# Altium footprint library ThanhNT.PcbLib: 579 footprints (part 8 of 37)
Each footprint in its own frame and in the unit in brackets; x right, y up, seen from the top. Pads: shape width x height; smd on the part's side, far side on the other; paste and mask are expansions set on the pad; w line width, h text height; cw(c..) or ccw(c..) is an arc to the next point about the centre after c.
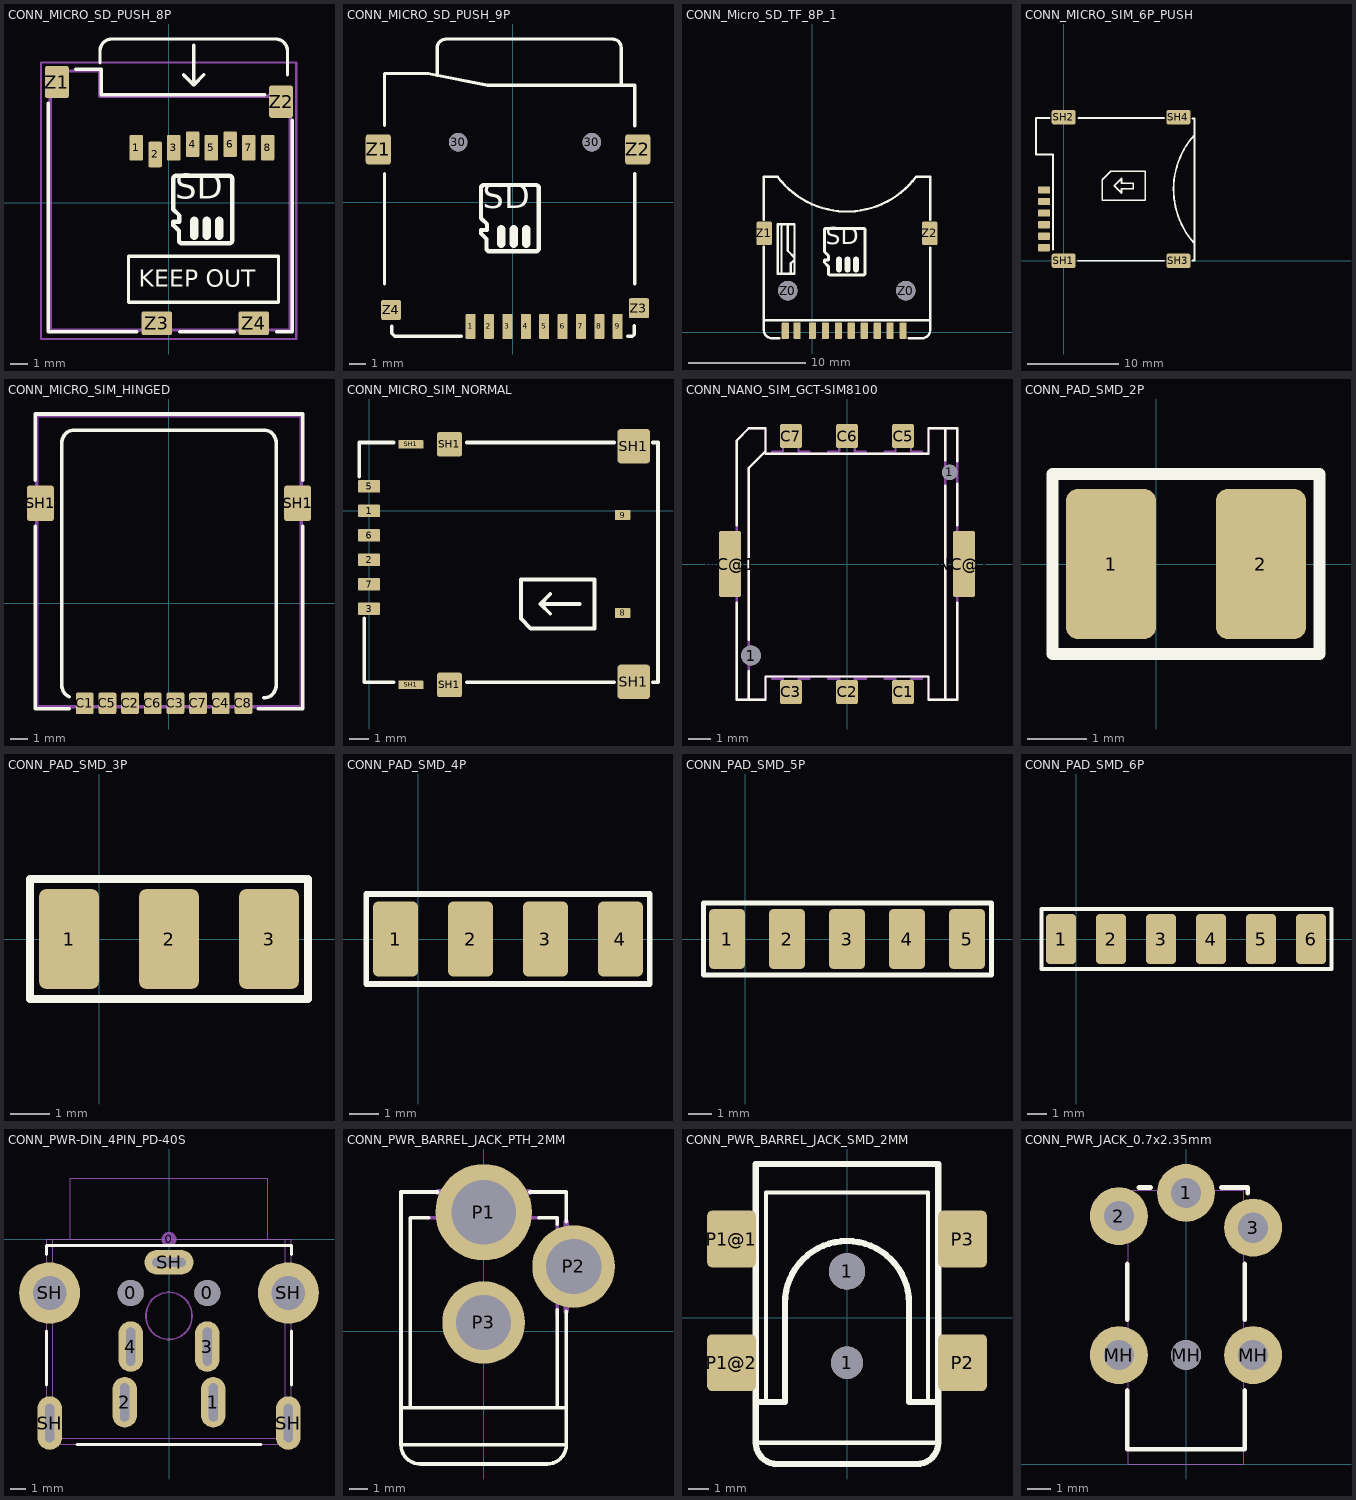
[diagram p7: the footprints below, top view; thin cyan lines are the x and y axes]

## CONN_MICRO_SD_PUSH_8P [mm] "WR-CRD Micro SD_Push and Push_Card Detection_8 pins (MinhHa TF v5)"
height 1.98
pads (12):
  rrect20% 0.8x1.5 smd: 1(-1.915,3.225) 2(-0.815,2.825) 3(0.285,3.225) 4(1.385,3.425) 5(2.485,3.225) 6(3.585,3.425) 7(4.685,3.225) 8(5.785,3.225)
  rrect20% 1.4x1.9 smd: Z1(-6.575,7.075) Z2(6.575,5.925)
  rrect20% 1.8x1.4 smd: Z3(-0.715,-7.075) Z4(4.975,-7.075)
Top Overlay:
  lines w0.2: -7.075,5.825 -7.075,-7.575 -1.875,-7.575 ; -5.475,7.825 -3.975,7.825 -3.975,6.325 5.625,6.325 ; -4.05,8.2 -4.05,8.9 cw(c-3.35,8.9) -3.35,9.6 6.25,9.6 cw(c6.25,8.9) 6.95,8.9 6.95,7.5 ; 0.625,-7.575 3.825,-7.575 ; 0.85,7.5 1.45,6.9 ; 1.45,9.25 1.45,6.9 ; 2.05,7.5 1.45,6.9 ; 6.325,-7.575 7.225,-7.575 7.225,4.825 ; -2.375,-5.847 6.425,-5.847 6.425,-3.147 -2.375,-3.147 -2.375,-5.847
  lines w0.254: 0.254,-1.321 0.254,-1.118 0.61,-1.118 0.61,-0.762 0.254,-0.406 0.254,1.321 0.254,1.401 cw(c0.427,1.401) 0.305,1.524 cw(c0.427,1.401) 0.427,1.575 0.508,1.575 3.454,1.575 3.535,1.575 cw(c3.535,1.401) 3.658,1.524 cw(c3.535,1.401) 3.708,1.401 3.708,1.321 3.708,-2.134 3.708,-2.214 cw(c3.535,-2.214) 3.658,-2.337 cw(c3.535,-2.214) 3.535,-2.388 3.454,-2.388 0.838,-2.388 0.758,-2.388 cw(c0.758,-2.214) 0.635,-2.337 cw(c0.758,-2.214) 0.584,-2.214 0.584,-2.134 0.584,-1.651 0.254,-1.321
  lines w0.508: 1.473,-1.93 1.473,-1.067 ; 2.21,-1.93 2.21,-1.067 ; 2.946,-1.93 2.946,-1.067
  text "SD" at 0.356,-0.279 h2.5
  text "KEEP OUT" at -1.775,-4.947 h1
Mechanical 15:
  lines w0.127: -7.518,-8.001 7.468,-8.001 7.468,8.23 -7.518,8.23 -7.518,-8.001
Mechanical 16:
  lines w0.2: -6.975,-7.475 -6.975,7.725 -4.075,7.725 -4.075,6.225 5.825,6.225 6.325,6.725 7.125,6.725 7.125,-7.475 -6.975,-7.475
3D body "693071010811.stp": height 1.84, standoff -0.06, extent -6.975,-7.625 7.025,7.585

## CONN_MICRO_SD_PUSH_9P [mm] "WR-CRD Micro SD_Push and Push_Card Detection_9 pins (MinhHa TF v3)"
pads (15):
  rrect20% 0.6x1.5 smd mask+0.01: 1(-2.529,-7.442) 2(-1.429,-7.442) 3(-0.329,-7.442) 4(0.771,-7.442) 5(1.871,-7.442) 6(2.971,-7.442) 7(4.071,-7.442) 8(5.171,-7.442) 9(6.271,-7.442)
  round 1.1 hole 1.1 unplated: 30(-3.276,3.581) 30(4.724,3.581)
  rrect20% 1.5x1.8 smd mask+0.01: Z1(-8.052,3.15) Z2(7.468,3.15)
  rrect20% 1.2x1.2 smd mask+0.01: Z3(7.544,-6.35) Z4(-7.29,-6.452)
Top Overlay:
  lines w0.2: -7.678,-4.902 -7.678,1.702 ; -7.678,4.6 -7.678,7.69 -5.068,7.69 -1.508,6.98 7.29,6.98 ; -7.239,-7.417 -7.239,-7.85 -7.058,-8.03 -7.028,-8.03 -3.078,-8.03 ; -4.521,7.576 -4.521,9.269 cw(c-4.088,9.269) -4.394,9.576 cw(c-3.965,9.147) -3.965,9.754 5.957,9.754 cw(c5.957,9.233) 6.325,9.601 cw(c5.957,9.233) 6.477,9.233 6.477,6.98 ; 6.881,-8.035 7.154,-8.035 7.264,-7.925 7.264,-7.401 ; 7.29,-4.902 7.29,1.702 ; 7.29,4.57 7.29,6.98 ; 7.29,6.98 7.29,6.98
  lines w0.254: -1.905,-1.88 -1.905,-1.676 -1.549,-1.676 -1.549,-1.321 -1.905,-0.965 -1.905,0.762 -1.905,0.843 cw(c-1.732,0.843) -1.854,0.965 cw(c-1.732,0.843) -1.732,1.016 -1.651,1.016 1.295,1.016 1.376,1.016 cw(c1.376,0.843) 1.499,0.965 cw(c1.376,0.843) 1.549,0.843 1.549,0.762 1.549,-2.692 1.549,-2.773 cw(c1.376,-2.773) 1.499,-2.896 cw(c1.376,-2.773) 1.376,-2.946 1.295,-2.946 -1.321,-2.946 -1.401,-2.946 cw(c-1.401,-2.773) -1.524,-2.896 cw(c-1.401,-2.773) -1.575,-2.773 -1.575,-2.692 -1.575,-2.21 -1.905,-1.88
  lines w0.508: -0.686,-2.489 -0.686,-1.626 ; 0.051,-2.489 0.051,-1.626 ; 0.787,-2.489 0.787,-1.626
  text "SD" at -1.803,-0.838 h2.5
3D body "SW3dPS-Micro_SD.STEP": height 1.95, standoff 0.97, extent -4.535,-5.374 6.465,9.627
3D body "MEM2055-00-190-01-A_revG.step": height 1.96, standoff -0.49, extent -8.279,-7.696 7.721,7.554

## CONN_Micro_SD_TF_8P_1 [mm] "MicroSD TF 8 Pin (MicroSD TF v1 - MinhHa)"
pads (14):
  rrect20% 0.6x1.4 smd: 1(-0.004,0.127) 2(1.096,0.127) 3(2.196,0.127) 4(3.296,0.127) 5(4.396,0.127) 6(5.496,0.127) 7(6.596,0.127) 8(7.696,0.127) 9(-2.304,0.127) 10(-1.294,0.127)
  round 1.65 hole 1.65 unplated: Z0(-2.083,3.531) Z0(7.917,3.531)
  rrect20% 1.3x2 smd: Z1(-4.089,8.382) Z2(9.957,8.382)
Top Overlay:
  lines w0.2: -4.14,9.525 -4.14,13.183 -2.946,13.183 ccw(c2.921,17.551) 8.788,13.183 9.982,13.183 9.982,9.525 ; -4.115,7.239 -4.115,1.016 ; -2.819,-0.508 -3.429,-0.508 cw(c-3.429,0.178) -4.115,0.178 -4.115,1.016 ; -2.616,4.953 -2.616,9.144 -2.489,9.144 ; -2.032,9.144 -2.083,9.144 -2.083,6.909 -1.524,6.35 -1.524,6.147 -1.829,5.842 -1.829,4.953 ; -1.575,4.953 -2.946,4.953 -2.946,9.144 -1.524,9.144 -1.524,4.953 ; 8.179,-0.508 9.296,-0.508 ccw(c9.296,0.178) 9.982,0.178 ; 9.982,0.193 9.982,1.016 ; 9.982,7.188 9.982,1.016 ; -4.115,1.016 9.982,1.016
  lines w0.254: 1.016,5.918 1.016,6.121 1.372,6.121 1.372,6.477 1.016,6.833 1.016,8.56 1.016,8.64 cw(c1.189,8.64) 1.067,8.763 cw(c1.189,8.64) 1.189,8.814 1.27,8.814 4.216,8.814 4.297,8.814 cw(c4.297,8.64) 4.42,8.763 cw(c4.297,8.64) 4.47,8.64 4.47,8.56 4.47,5.105 4.47,5.025 cw(c4.297,5.025) 4.42,4.902 cw(c4.297,5.025) 4.297,4.851 4.216,4.851 1.6,4.851 1.52,4.851 cw(c1.52,5.025) 1.397,4.902 cw(c1.52,5.025) 1.346,5.025 1.346,5.105 1.346,5.588 1.016,5.918
  lines w0.508: 2.235,5.309 2.235,6.172 ; 2.972,5.309 2.972,6.172 ; 3.708,5.309 3.708,6.172
  text "SD" at 1.118,6.96 h2.5
3D body "User Library-Socket-MicroSD-Type1-with-SDCard.STEP": height 1.8, standoff -0.54, extent -4.104,-0.533 9.996,19.567

## CONN_MICRO_SIM_6P_PUSH [mm]
pads (10):
  rrect30% 1.34x0.8 smd: CLK(-2.159,7.798) DATA(-2.159,6.524) GND(-2.159,1.428) RST(-2.159,5.25) VCC(-2.159,2.702) VPP(-2.159,3.976)
  rrect30% 2.65x1.6 smd: SH1(0,0) SH2(0,15.8) SH3(12.63,0) SH4(12.63,15.8)
Top Overlay:
  lines w0.2: -1.575,15.723 -3.048,15.723 -3.048,11.709 -1.194,11.709 -1.194,1.245 ; 1.575,0 11.049,0 ; 1.6,15.723 11.049,15.723 ; 14.173,0.025 14.402,0.025 14.402,15.646 14.173,15.646 ; 14.351,1.936 cw(c21.031,7.874) 14.402,13.868 ; 4.242,6.655 8.966,6.655 8.966,9.855 5.156,9.855 4.242,8.941 4.242,6.655 ; 5.563,8.255 6.35,9.042 6.35,8.534 7.645,8.534 7.645,7.95 7.62,7.925 6.35,7.925 6.35,7.468 5.563,8.255
3D body "User Library-Sim Holder.STEP": height 1.36, standoff 0.01, extent -3.001,-0.377 14.199,16.023

## CONN_MICRO_SIM_HINGED [mm] "Wurth Electronics 693022010811"
pads (10):
  rrect20% 1x1.2 smd mask+0.06: C1(-4.72,-5.6) C2(-2.18,-5.6) C3(0.36,-5.6) C4(2.9,-5.6) C5(-3.45,-5.6) C6(-0.91,-5.6) C7(1.63,-5.6) C8(4.17,-5.6)
  rrect20% 1.5x2 smd: SH1(-7.2,5.6) SH1(7.2,5.6)
Top Overlay:
  lines w0.2: -7.5,4.3 -7.5,-5.9 -5.6,-5.9 ; -7.5,6.9 -7.5,10.6 7.5,10.6 7.5,6.9 ; -5.576,-5.243 cw(c-5.3,-4.6) -6,-4.6 -6,9 cw(c-5.3,9) -5.3,9.7 5.3,9.7 cw(c5.3,9) 6,9 6,-4.6 cw(c5.3,-4.6) 5.3,-5.3 ; 5,-5.9 7.5,-5.9 7.5,4.3
Mechanical 16:
  lines w0.2: -7.4,-5.8 7.4,-5.8 7.4,10.5 -7.4,10.5 -7.4,-5.8
3D body "693022010811.stp": height 1.87, standoff -0.08, extent -7.7,-5.8 7.7,10.5

## CONN_MICRO_SIM_NORMAL [mm] "Molex 78646-3001"
pads (14):
  rrect20% 1.15x0.65 smd: 1(0,0) 2(0,-2.54) 3(0,-5.08) 5(0,1.27) 6(0,-1.27) 7(0,-3.81)
  rrect20% 0.8x0.54 smd: 8(13.15,-5.295) 9(13.15,-0.215)
  rrect20% 1.3x0.45 smd: SH1(2.17,-9.025) SH1(2.17,3.455)
  rrect20% 1.3x1.27 smd: SH1(4.17,-9.025) SH1(4.17,3.455)
  rrect20% 1.7x1.778 smd: SH1(13.73,-8.865) SH1(13.73,3.355)
Top Overlay:
  lines w0.2: -0.508,1.778 -0.508,3.556 1.27,3.556 ; -0.254,-5.588 -0.254,-8.89 1.27,-8.89 ; 5.08,-8.89 12.7,-8.89 ; 5.08,3.556 12.7,3.556 ; 9.398,-5.334 8.89,-4.826 ; 9.398,-4.318 8.89,-4.826 ; 10.922,-4.826 8.89,-4.826 ; 14.732,-8.89 14.986,-8.89 14.986,3.556 14.732,3.556 ; 7.874,-5.588 8.382,-6.096 11.684,-6.096 11.684,-3.556 7.874,-3.556 7.874,-5.588
3D body "786463001.stp": height 1.43, standoff -0.02, extent -0.406,-9.268 15.044,3.782

## CONN_NANO_SIM_GCT-SIM8100 [mm]
pads (10):
  round 0.9 hole 0.9: 1(-4.35,-4.15)
  round 0.7 hole 0.7: 1(4.65,4.15)
  rrect20% 1x1.1 smd: C1(2.54,-5.8) C2(0,-5.8) C3(-2.54,-5.8) C5(2.54,5.8) C6(0,5.8) C7(-2.54,5.8)
  rrect20% 1x3 smd: NC@1(-5.3,0) NC@2(5.3,0)
Top Overlay:
  lines w0.1: -5,-1.75 -5,-6.15 -4.45,-6.15 ; -5,1.75 -5,5.6 -4.45,6.15 -3.7,6.15 -3.7,5.1 ; -4.45,-4.85 -4.45,-6.15 ; -4.45,-3.45 -4.45,4.35 -3.7,5.1 ; 4.45,3.55 4.45,-6.15 ; 4.45,4.7 4.45,6.15 ; 5,-1.75 5,-6.15 4.45,-6.15 ; 5,1.75 5,3.65 ; 5,4.65 5,6.15 4.45,6.15 ; -4.45,-6.15 -3.7,-6.15 -3.7,-5.1 3.7,-5.1 3.7,-6.15 4.45,-6.15 ; -3.7,5.1 -3.7,5 3.7,5 3.7,6.15 4.45,6.15
Mechanical 16:
  lines w0.1: -4.45,-6.15 -5,-6.15 -5,5.6 -4.45,6.15 -3.7,6.15 -3.7,5.1 ; -4.45,-6.15 -3.7,-6.15 -3.7,-5.1 -3.4,-5.1 ; -4.45,-6.15 -4.45,4.35 -3.7,5.1 ; -3.7,5.1 -3.7,5 -3.4,5 ; -3.4,-5.1 -1.7,-5.1 ; -3.4,-5.1 -3.4,-5.2 -2.9,-5.2 -2.9,-5.9 ccw(c-2.55,-5.78) -2.2,-5.9 -2.2,-5.2 -1.7,-5.2 -1.7,-5.1 ; -3.4,5 -1.7,5 ; -3.4,5 -3.4,5.1 -2.9,5.1 -2.9,5.9 cw(c-2.55,5.781) -2.2,5.9 -2.2,5.1 -1.7,5.1 -1.7,5 ; -1.7,-5.1 -0.85,-5.1 ; -1.7,5 -0.85,5 ; -0.85,-5.1 0.85,-5.1 ; -0.85,-5.1 -0.85,-5.2 -0.35,-5.2 -0.35,-5.9 ccw(c0,-5.785) 0.35,-5.9 0.35,-5.2 0.85,-5.2 0.85,-5.1 ; -0.85,5 0.85,5 ; -0.85,5 -0.85,5.1 -0.35,5.1 -0.35,5.9 cw(c0,5.78) 0.35,5.9 0.35,5.1 0.85,5.1 0.85,5 ; 0.85,-5.1 1.7,-5.1 ; 0.85,5 1.7,5 ; 1.7,-5.1 3.4,-5.1 ; 1.7,-5.1 1.7,-5.2 2.2,-5.2 2.2,-5.9 ccw(c2.55,-5.78) 2.9,-5.9 2.9,-5.2 3.4,-5.2 3.4,-5.1 ; 1.7,5 3.4,5 ; 1.7,5 1.7,5.1 2.2,5.1 2.2,5.9 cw(c2.55,5.78) 2.9,5.9 2.9,5.1 3.4,5.1 3.4,5 ; 3.4,-5.1 3.7,-5.1 3.7,-6.15 4.45,-6.15 ; 3.4,5 3.7,5 3.7,6.15 4.45,6.15 ; 4.45,-6.15 5,-6.15 5,6.15 4.45,6.15 ; 4.45,-6.15 4.45,6.15

## CONN_PAD_SMD_2P [mil] "SMT Battery jumper pads"
pads (2):
  rrect25% 60x100 smd: 1(-30,0) 2(70,0)
Top Overlay:
  lines w7.87: -69,-60 -69,60 109,60 109,-60 -69,-60
Mechanical 13:
  lines w3: -68,-60 -68,60 109,60 109,-60 -68,-60

## CONN_PAD_SMD_3P [mil] "SMT Battery jumper pads"
pads (3):
  rrect25% 60x100 smd: 1(-30,0) 2(70,0) 3(170,0)
Top Overlay:
  lines w7.87: -69,-60 -69,60 209,60 209,-60 -69,-60
Mechanical 13:
  lines w3: -68,-60 -68,60 209,60 209,-60 -68,-60

## CONN_PAD_SMD_4P [mil] "SMT Battery jumper pads"
pads (4):
  rrect25% 60x100 smd: 1(-30,0) 2(70,0) 3(170,0) 4(270,0)
Top Overlay:
  lines w7.87: -69,-60 309,-60 309,60 -69,60 -69,-60
Mechanical 13:
  lines w3: -68,-60 309,-60 309,60 -68,60 -68,-60

## CONN_PAD_SMD_5P [mil] "SMT Battery jumper pads"
pads (5):
  rrect25% 60x100 smd: 1(-30,0) 2(70,0) 3(170,0) 4(270,0) 5(370,0)
Top Overlay:
  lines w7.87: -69,-60 -69,60 411,60 411,-60 -69,-60
Mechanical 13:
  lines w3: -68,-60 -68,60 410,60 410,-60 -68,-60

## CONN_PAD_SMD_6P [mil] "SMT Battery jumper pads"
pads (6):
  rrect25% 60x100 smd: 1(-30,0) 2(70,0) 3(170,0) 4(270,0) 5(370,0) 6(470,0)
Top Overlay:
  lines w7.87: -69,-60 511,-60 511,60 -69,60 -69,-60
Mechanical 13:
  lines w3: -68,-60 510,-60 510,60 -68,60 -68,-60

## CONN_PWR-DIN_4PIN_PD-40S [mm] "Power Connector, 4-pin DIN"
height 15
pads (12):
  round 1.7 hole 1.7 unplated: 0(-2.5,-3.5) 0(2.5,-3.5)
  round 1 on Mech15: 0(0,0)
  oval 1.6x3.3 hole 0.6 slot 2.5 at 90 deg: 1(2.9,-10.65) 2(-2.9,-10.65) 3(2.5,-7) 4(-2.5,-7)
  oval 1.6x3.5 hole 0.6 slot 2.5 at 90 deg: SH(-7.8,-12) SH(7.8,-12)
  round 4 hole 2.2: SH(-7.8,-3.5) SH(7.8,-3.5)
  oval 3.2x1.6 hole 0.6 slot 2.2 at 0 deg: SH(0,-1.5)
Top Overlay:
  lines w0.2: -8,-9.5 -8,-6 ; -8,-1 -8,-0.4 8,-0.4 8,-1 ; -6,-13.4 6,-13.4 ; 8,-9.5 8,-6
Mechanical 13:
  circle w0.05: c0,-5 r1.55
  circle w0.05: c0,-5 r1.5
  lines w0.05: -7.6,0 -7.6,-13.4 ; -6.45,0 -6.45,4 6.45,4 6.45,0 ; 7.6,0 7.6,-13.4 ; -8,-13 ccw(c-7.6,-13) -7.6,-13.4 ; -8,-13 8,-13 ; -8,-13 -8,0 8,0 8,-13 ; -7.6,-13.4 7.6,-13.4 ; 7.6,-13.4 ccw(c7.6,-13) 8,-13
3D body "PD-40S.STEP": height 15, standoff -3.5, extent -8,-13.4 8,4

## CONN_PWR_BARREL_JACK_PTH_2MM [mm]
pads (3):
  round 5.25 hole 3.5: P1(0,6.475)
  round 4.5 hole 3: P2(4.9,3.525) P3(0,0.475)
Top Overlay:
  lines w0.2: -4,-4.165 -4,6.175 -3,6.175 ; -2.5,7.575 -4.5,7.575 -4.5,-4.165 ; 2.5,7.575 4.5,7.575 4.5,5.96 ; 3,6.175 4,6.175 4,5.835 ; 3.988,-4.165 -4.5,-4.165 ; 4,1.175 4,-4.165 4.5,-4.165 ; 4.5,1.075 4.5,-4.165 ; -4.5,-6.175 ccw(c-3.45,-6.175) -3.45,-7.225 3.45,-7.225 ccw(c3.45,-6.175) 4.5,-6.175 ; -4.5,-6.175 -4.5,-4.165 ; -4.5,-6.175 4.5,-6.175 ; 4.5,-6.175 4.5,-4.165
Mechanical 13:
  lines w0.203: -3,6.175 3,6.175 ; 4,0.835 4,6.175
  lines w0.305: -2.5,7.575 2.5,7.575 ; 4.5,1.085 4.5,5.95

## CONN_PWR_BARREL_JACK_SMD_2MM [mm]
pads (6):
  round 1.6 hole 1.6: 1(0,-2.225)
  round 1.8 hole 1.8: 1(0,2.275)
  rrect20% 2.4x2.8 smd: P1@1(-5.7,3.875) P1@2(-5.7,-2.225) P2(5.7,-2.225) P3(5.7,3.875)
Top Overlay:
  lines w0.203: -4.5,-6.175 4.5,-6.175 ; -4,-4.165 -4,6.175 4,6.175 4,-4.165
  lines w0.305: -4.5,-4.165 -3.06,-4.165 -3.06,0.715 cw(c0,0.715) 3.06,0.715 3.06,-4.165 4.5,-4.165 ; -4.5,-4.165 -4.5,7.575 4.5,7.575 4.5,-4.165 ; -4.5,-4.165 -4.5,-6.175 ccw(c-3.45,-6.175) -3.45,-7.225 3.45,-7.225 ccw(c3.45,-6.175) 4.5,-6.175 4.5,-4.165
Mechanical 14:
  lines w0.125: -4.5,-2.975 -6.3,-2.975 -6.3,-1.475 -4.5,-1.475 ; -4.5,3.125 -6.3,3.125 -6.3,4.625 -4.5,4.625 ; 4.5,-2.975 6.3,-2.975 6.3,-1.475 4.5,-1.475 ; 4.5,3.125 6.3,3.125 6.3,4.625 4.5,4.625

## CONN_PWR_JACK_0.7x2.35mm [mm] "Power Connector, 0.7mm ID, 2.35mm OD"
height 5
pads (6):
  round 2.5 hole 1.3: 1(0,11.7) 2(-2.9,10.7) 3(2.9,10.2) MH(-2.9,4.7) MH(2.9,4.7)
  round 1.3 hole 1.3 unplated: MH(0,4.7)
Top Overlay:
  lines w0.2: -2.54,3.175 -2.54,0.635 2.54,0.635 2.54,3.175 ; -2.54,6.223 -2.54,8.636 ; -2.032,11.938 -1.524,11.938 ; 1.524,11.938 2.667,11.938 2.667,11.684 ; 2.54,6.223 2.54,8.636
Mechanical 13:
  lines w0.05: -2.819,4.204 -2.819,5.194 ; -2.819,10.198 -2.819,11.189 ; -2.502,4.204 -3.073,4.204 -3.073,5.194 -2.502,5.194 ; -2.502,10.198 -3.073,10.198 -3.073,11.189 -2.502,11.189 ; -0.495,11.811 -0.495,11.938 0.495,11.938 0.495,11.811 ; 2.502,4.204 3.073,4.204 3.073,5.194 2.502,5.194 ; 2.502,9.716 3.073,9.716 3.073,10.706 2.502,10.706 ; 2.819,4.204 2.819,5.194 ; 2.819,9.716 2.819,10.706 ; -2.502,0 2.502,0 2.502,11.811 -2.502,11.811 -2.502,0
3D body "Conn_Kobiconn_163-4307-E.stp": height 5, standoff -2.5, extent -3.309,0 3.309,12.054